# Altium footprint library DS3231_1.PcbLib: 1 footprints
Each footprint in its own frame and in the unit in brackets; x right, y up, seen from the top. Pads: shape width x height; smd on the part's side, far side on the other; paste and mask are expansions set on the pad; w line width, h text height; cw(c..) or ccw(c..) is an arc to the next point about the centre after c.
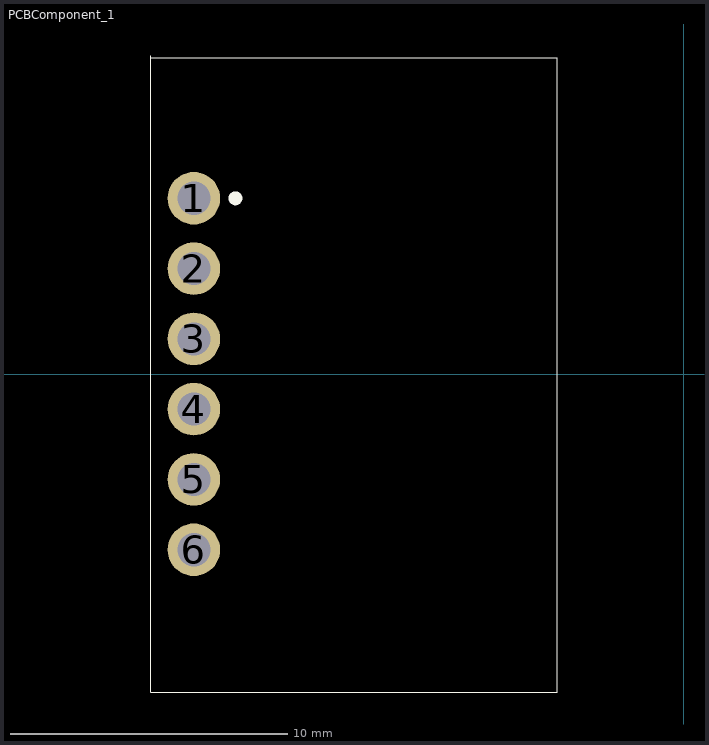
[diagram p0: the footprint, top view; thin cyan lines are the x and y axes]

## PCBComponent_1 [mm]
pads (7):
  round 1.9 hole 1.2 mask+0.076: 1(-17.7,6.35) 1(-17.7,6.35) 2(-17.7,3.81) 3(-17.7,1.27) 4(-17.7,-1.27) 5(-17.7,-3.81) 6(-17.7,-6.35)
Top Overlay:
  circle w0.254: c-16.2,6.35 r0.125
  lines w0.005: -19.25,11.43 -4.575,11.43 -4.575,-11.5 -19.25,-11.5 -19.25,11.5
3D body "DS3231 RTC.SLDPRT": height 41.3, standoff -3.45, extent -18.095,-11.4 -4.565,11.4